# Altium schematic symbol library jlcpcb_2025_04_capacitors_extended_0402.schlib: 3594 symbols (part 13 of 20) (continued)
## GCM155R71H821KA37D
designator C?  Capacitance: 820pF  (hidden comment: *)
Capacitor, Ceramic (MLCC), 820pF, ±10%, 50V, X7R, ±10%, SMD 0402; Manufacturer: Murata Electronics; Manufacturer Part Number: GCM155R71H821KA37D; Package Size: 0402; JLCPCB Basic Part: No; JLCPCB Part Number: C2891595; Supplier 1: LCSC; Category: Capacitors - MLCC; Supplier Part Number 1: C2891595; Tolerance: ±10%; Voltage Rating: 50V; Temperature Coefficient: X7R; RoHS: Yes; ComponentLink1Description: Datasheet; ComponentLink1URL: https://wmsc.lcsc.com/wmsc/upload/file/pdf/v2/lcsc/2109101930_Murata-Electronics-GCM155R71H821KA37D_C2891595.pdf; ComponentLink2Description: JLCPCB Part URL; ComponentLink2URL: https://jlcpcb.com/partdetail/C2891595; ComponentLink3Description: LCSC Part URL; ComponentLink3URL: https://lcsc.com/product-detail/Multilayer-Ceramic-Capacitors-MLCC---SMD-SMT_Murata-Electronics-Murata-Electronics-GCM155R71H821KA37D_C2891595.html
footprint CAP-0402 (0402 (1005M) Capacitor)
pins: 1, 2

## GCM155R71H822KA55D
designator C?  Capacitance: 8.2nF  (hidden comment: *)
Capacitor, Ceramic (MLCC), 8.2nF, ±10%, 50V, X7R, ±10%, SMD 0402; Manufacturer: Murata Electronics; Manufacturer Part Number: GCM155R71H822KA55D; Package Size: 0402; JLCPCB Basic Part: No; JLCPCB Part Number: C161172; Supplier 1: LCSC; Category: Capacitors - MLCC; Supplier Part Number 1: C161172; Tolerance: ±10%; Voltage Rating: 50V; Temperature Coefficient: X7R; RoHS: Yes; ComponentLink1Description: Datasheet; ComponentLink1URL: https://wmsc.lcsc.com/wmsc/upload/file/pdf/v2/lcsc/2304140030_Murata-Electronics-GCM155R71H822KA55D_C161172.pdf; ComponentLink2Description: JLCPCB Part URL; ComponentLink2URL: https://jlcpcb.com/partdetail/C161172; ComponentLink3Description: LCSC Part URL; ComponentLink3URL: https://lcsc.com/product-detail/Multilayer-Ceramic-Capacitors-MLCC---SMD-SMT_Murata-Electronics-Murata-Electronics-GCM155R71H822KA55D_C161172.html
footprint CAP-0402 (0402 (1005M) Capacitor)
pins: 1, 2

## GCM155R72A102KA37D
designator C?  Capacitance: 1nF  (hidden comment: *)
Capacitor, Ceramic (MLCC), 1nF, ±10%, 100V, X7R, ±10%, SMD 0402; Manufacturer: Murata Electronics; Manufacturer Part Number: GCM155R72A102KA37D; Package Size: 0402; JLCPCB Basic Part: No; JLCPCB Part Number: C126538; Supplier 1: LCSC; Category: Capacitors - MLCC; Supplier Part Number 1: C126538; Tolerance: ±10%; Voltage Rating: 100V; Temperature Coefficient: X7R; RoHS: Yes; ComponentLink1Description: Datasheet; ComponentLink1URL: https://wmsc.lcsc.com/wmsc/upload/file/pdf/v2/lcsc/1811081510_Murata-Electronics-GCM155R72A102KA37D_C126538.pdf; ComponentLink2Description: JLCPCB Part URL; ComponentLink2URL: https://jlcpcb.com/partdetail/C126538; ComponentLink3Description: LCSC Part URL; ComponentLink3URL: https://lcsc.com/product-detail/Multilayer-Ceramic-Capacitors-MLCC---SMD-SMT_Murata-Electronics-Murata-Electronics-GCM155R72A102KA37D_C126538.html
footprint CAP-0402 (0402 (1005M) Capacitor)
pins: 1, 2

## GCM155R72A152KA37D
designator C?  Capacitance: 1.5nF  (hidden comment: *)
Capacitor, Ceramic (MLCC), 1.5nF, ±10%, 100V, X7R, ±10%, SMD 0402; Manufacturer: Murata Electronics; Manufacturer Part Number: GCM155R72A152KA37D; Package Size: 0402; JLCPCB Basic Part: No; JLCPCB Part Number: C782041; Supplier 1: LCSC; Category: Capacitors - MLCC; Supplier Part Number 1: C782041; Tolerance: ±10%; Voltage Rating: 100V; Temperature Coefficient: X7R; RoHS: Yes; ComponentLink1Description: Datasheet; ComponentLink1URL: https://wmsc.lcsc.com/wmsc/upload/file/pdf/v2/lcsc/2304140030_Murata-Electronics-GCM155R72A152KA37D_C782041.pdf; ComponentLink2Description: JLCPCB Part URL; ComponentLink2URL: https://jlcpcb.com/partdetail/C782041; ComponentLink3Description: LCSC Part URL; ComponentLink3URL: https://lcsc.com/product-detail/Multilayer-Ceramic-Capacitors-MLCC---SMD-SMT_Murata-Electronics-Murata-Electronics-GCM155R72A152KA37D_C782041.html
footprint CAP-0402 (0402 (1005M) Capacitor)
pins: 1, 2

## GCM155R72A182KA37D
designator C?  Capacitance: 1.8nF  (hidden comment: *)
Capacitor, Ceramic (MLCC), 1.8nF, ±10%, 100V, X7R, ±10%, SMD 0402; Manufacturer: Murata Electronics; Manufacturer Part Number: GCM155R72A182KA37D; Package Size: 0402; JLCPCB Basic Part: No; JLCPCB Part Number: C2941941; Supplier 1: LCSC; Category: Capacitors - MLCC; Supplier Part Number 1: C2941941; Tolerance: ±10%; Voltage Rating: 100V; Temperature Coefficient: X7R; RoHS: Yes; ComponentLink1Description: Datasheet; ComponentLink1URL: https://wmsc.lcsc.com/wmsc/upload/file/pdf/v2/lcsc/2201121900_Murata-Electronics-GCM155R72A182KA37D_C2941941.pdf; ComponentLink2Description: JLCPCB Part URL; ComponentLink2URL: https://jlcpcb.com/partdetail/C2941941; ComponentLink3Description: LCSC Part URL; ComponentLink3URL: https://lcsc.com/product-detail/Multilayer-Ceramic-Capacitors-MLCC---SMD-SMT_Murata-Electronics-Murata-Electronics-GCM155R72A182KA37D_C2941941.html
footprint CAP-0402 (0402 (1005M) Capacitor)
pins: 1, 2

## GCM155R72A221KA37D
designator C?  Capacitance: 220pF  (hidden comment: *)
Capacitor, Ceramic (MLCC), 220pF, ±10%, 100V, ±10%, SMD 0402; Manufacturer: Murata Electronics; Manufacturer Part Number: GCM155R72A221KA37D; Package Size: 0402; JLCPCB Basic Part: No; JLCPCB Part Number: C440146; Supplier 1: LCSC; Category: Capacitors - MLCC; Supplier Part Number 1: C440146; Tolerance: ±10%; Voltage Rating: 100V; RoHS: Yes; ComponentLink1Description: Datasheet; ComponentLink1URL: https://wmsc.lcsc.com/wmsc/upload/file/pdf/v2/lcsc/2304140030_Murata-Electronics-GCM155R72A221KA37D_C440146.pdf; ComponentLink2Description: JLCPCB Part URL; ComponentLink2URL: https://jlcpcb.com/partdetail/C440146; ComponentLink3Description: LCSC Part URL; ComponentLink3URL: https://lcsc.com/product-detail/Multilayer-Ceramic-Capacitors-MLCC---SMD-SMT_Murata-Electronics-Murata-Electronics-GCM155R72A221KA37D_C440146.html
footprint CAP-0402 (0402 (1005M) Capacitor)
pins: 1, 2

## GCM155R72A222KA01D
designator C?  Capacitance: 2.2nF  (hidden comment: *)
Capacitor, Ceramic (MLCC), 2.2nF, ±10%, 100V, X7R, ±10%, SMD 0402; Manufacturer: Murata Electronics; Manufacturer Part Number: GCM155R72A222KA01D; Package Size: 0402; JLCPCB Basic Part: No; JLCPCB Part Number: C2980802; Supplier 1: LCSC; Category: Capacitors - MLCC; Supplier Part Number 1: C2980802; Tolerance: ±10%; Voltage Rating: 100V; Temperature Coefficient: X7R; RoHS: Yes; ComponentLink1Description: Datasheet; ComponentLink1URL: https://wmsc.lcsc.com/wmsc/upload/file/pdf/v2/lcsc/2203041730_Murata-Electronics-GCM155R72A222KA01D_C2980802.pdf; ComponentLink2Description: JLCPCB Part URL; ComponentLink2URL: https://jlcpcb.com/partdetail/C2980802; ComponentLink3Description: LCSC Part URL; ComponentLink3URL: https://lcsc.com/product-detail/Multilayer-Ceramic-Capacitors-MLCC---SMD-SMT_Murata-Electronics-Murata-Electronics-GCM155R72A222KA01D_C2980802.html
footprint CAP-0402 (0402 (1005M) Capacitor)
pins: 1, 2

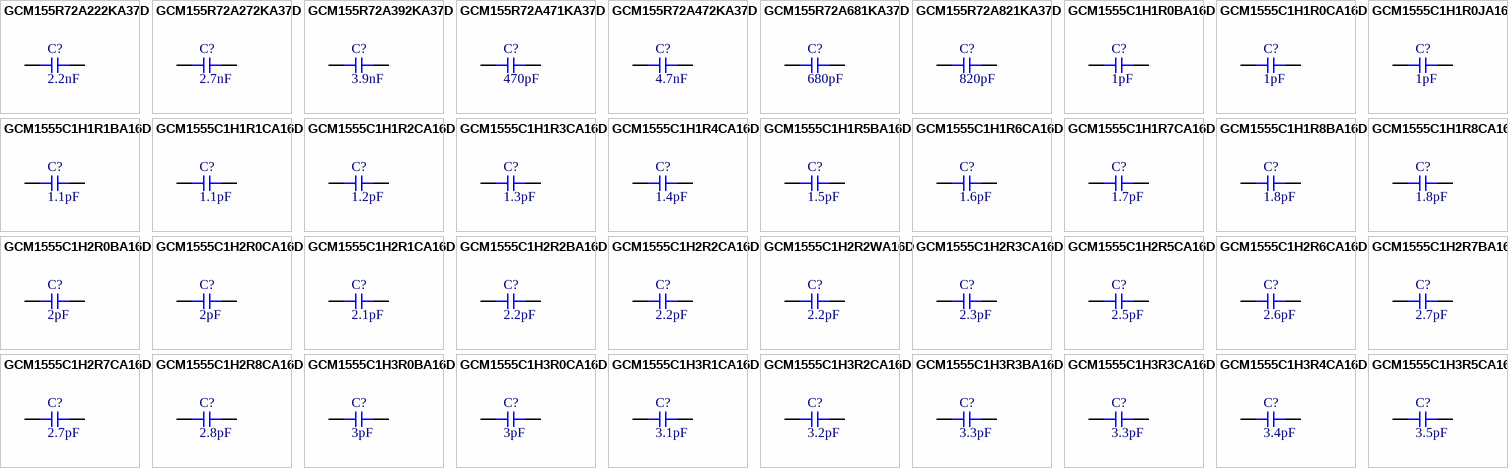
[diagram p57: symbols GCM155R72A222KA37D to GCM1555C1H3R5CA16D]

## GCM155R72A222KA37D
designator C?  Capacitance: 2.2nF  (hidden comment: *)
Capacitor, Ceramic (MLCC), 2.2nF, ±10%, 100V, X7R, ±10%, SMD 0402; Manufacturer: Murata Electronics; Manufacturer Part Number: GCM155R72A222KA37D; Package Size: 0402; JLCPCB Basic Part: No; JLCPCB Part Number: C710671; Supplier 1: LCSC; Category: Capacitors - MLCC; Supplier Part Number 1: C710671; Tolerance: ±10%; Voltage Rating: 100V; Temperature Coefficient: X7R; RoHS: Yes; ComponentLink1Description: Datasheet; ComponentLink1URL: https://wmsc.lcsc.com/wmsc/upload/file/pdf/v2/lcsc/2109092030_Murata-Electronics-GCM155R72A222KA37D_C710671.pdf; ComponentLink2Description: JLCPCB Part URL; ComponentLink2URL: https://jlcpcb.com/partdetail/C710671; ComponentLink3Description: LCSC Part URL; ComponentLink3URL: https://lcsc.com/product-detail/Multilayer-Ceramic-Capacitors-MLCC---SMD-SMT_Murata-Electronics-Murata-Electronics-GCM155R72A222KA37D_C710671.html
footprint CAP-0402 (0402 (1005M) Capacitor)
pins: 1, 2

## GCM155R72A272KA37D
designator C?  Capacitance: 2.7nF  (hidden comment: *)
Capacitor, Ceramic (MLCC), 2.7nF, ±10%, 100V, X7R, ±10%, SMD 0402; Manufacturer: Murata Electronics; Manufacturer Part Number: GCM155R72A272KA37D; Package Size: 0402; JLCPCB Basic Part: No; JLCPCB Part Number: C2941940; Supplier 1: LCSC; Category: Capacitors - MLCC; Supplier Part Number 1: C2941940; Tolerance: ±10%; Voltage Rating: 100V; Temperature Coefficient: X7R; RoHS: Yes; ComponentLink1Description: Datasheet; ComponentLink1URL: https://wmsc.lcsc.com/wmsc/upload/file/pdf/v2/lcsc/2201121900_Murata-Electronics-GCM155R72A272KA37D_C2941940.pdf; ComponentLink2Description: JLCPCB Part URL; ComponentLink2URL: https://jlcpcb.com/partdetail/C2941940; ComponentLink3Description: LCSC Part URL; ComponentLink3URL: https://lcsc.com/product-detail/Multilayer-Ceramic-Capacitors-MLCC---SMD-SMT_Murata-Electronics-Murata-Electronics-GCM155R72A272KA37D_C2941940.html
footprint CAP-0402 (0402 (1005M) Capacitor)
pins: 1, 2

## GCM155R72A392KA37D
designator C?  Capacitance: 3.9nF  (hidden comment: *)
Capacitor, Ceramic (MLCC), 3.9nF, ±10%, 100V, X7R, ±10%, SMD 0402; Manufacturer: Murata Electronics; Manufacturer Part Number: GCM155R72A392KA37D; Package Size: 0402; JLCPCB Basic Part: No; JLCPCB Part Number: C2941956; Supplier 1: LCSC; Category: Capacitors - MLCC; Supplier Part Number 1: C2941956; Tolerance: ±10%; Voltage Rating: 100V; Temperature Coefficient: X7R; RoHS: Yes; ComponentLink1Description: Datasheet; ComponentLink1URL: https://wmsc.lcsc.com/wmsc/upload/file/pdf/v2/lcsc/2201121900_Murata-Electronics-GCM155R72A392KA37D_C2941956.pdf; ComponentLink2Description: JLCPCB Part URL; ComponentLink2URL: https://jlcpcb.com/partdetail/C2941956; ComponentLink3Description: LCSC Part URL; ComponentLink3URL: https://lcsc.com/product-detail/Multilayer-Ceramic-Capacitors-MLCC---SMD-SMT_Murata-Electronics-Murata-Electronics-GCM155R72A392KA37D_C2941956.html
footprint CAP-0402 (0402 (1005M) Capacitor)
pins: 1, 2

## GCM155R72A471KA37D
designator C?  Capacitance: 470pF  (hidden comment: *)
Capacitor, Ceramic (MLCC), 470pF, ±10%, 100V, X7R, ±10%, SMD 0402; Manufacturer: Murata Electronics; Manufacturer Part Number: GCM155R72A471KA37D; Package Size: 0402; JLCPCB Basic Part: No; JLCPCB Part Number: C464449; Supplier 1: LCSC; Category: Capacitors - MLCC; Supplier Part Number 1: C464449; Tolerance: ±10%; Voltage Rating: 100V; Temperature Coefficient: X7R; RoHS: Yes; ComponentLink1Description: Datasheet; ComponentLink1URL: https://wmsc.lcsc.com/wmsc/upload/file/pdf/v2/lcsc/2304140030_Murata-Electronics-GCM155R72A471KA37D_C464449.pdf; ComponentLink2Description: JLCPCB Part URL; ComponentLink2URL: https://jlcpcb.com/partdetail/C464449; ComponentLink3Description: LCSC Part URL; ComponentLink3URL: https://lcsc.com/product-detail/Multilayer-Ceramic-Capacitors-MLCC---SMD-SMT_Murata-Electronics-Murata-Electronics-GCM155R72A471KA37D_C464449.html
footprint CAP-0402 (0402 (1005M) Capacitor)
pins: 1, 2

## GCM155R72A472KA37D
designator C?  Capacitance: 4.7nF  (hidden comment: *)
Capacitor, Ceramic (MLCC), 4.7nF, ±10%, 100V, X7R, ±10%, SMD 0402; Manufacturer: Murata Electronics; Manufacturer Part Number: GCM155R72A472KA37D; Package Size: 0402; JLCPCB Basic Part: No; JLCPCB Part Number: C710673; Supplier 1: LCSC; Category: Capacitors - MLCC; Supplier Part Number 1: C710673; Tolerance: ±10%; Voltage Rating: 100V; Temperature Coefficient: X7R; RoHS: Yes; ComponentLink1Description: Datasheet; ComponentLink1URL: https://wmsc.lcsc.com/wmsc/upload/file/pdf/v2/lcsc/2304140030_Murata-Electronics-GCM155R72A472KA37D_C710673.pdf; ComponentLink2Description: JLCPCB Part URL; ComponentLink2URL: https://jlcpcb.com/partdetail/C710673; ComponentLink3Description: LCSC Part URL; ComponentLink3URL: https://lcsc.com/product-detail/Multilayer-Ceramic-Capacitors-MLCC---SMD-SMT_Murata-Electronics-Murata-Electronics-GCM155R72A472KA37D_C710673.html
footprint CAP-0402 (0402 (1005M) Capacitor)
pins: 1, 2

## GCM155R72A681KA37D
designator C?  Capacitance: 680pF  (hidden comment: *)
Capacitor, Ceramic (MLCC), 680pF, ±10%, 100V, X7R, ±10%, SMD 0402; Manufacturer: Murata Electronics; Manufacturer Part Number: GCM155R72A681KA37D; Package Size: 0402; JLCPCB Basic Part: No; JLCPCB Part Number: C2189089; Supplier 1: LCSC; Category: Capacitors - MLCC; Supplier Part Number 1: C2189089; Tolerance: ±10%; Voltage Rating: 100V; Temperature Coefficient: X7R; RoHS: Yes; ComponentLink1Description: Datasheet; ComponentLink1URL: https://wmsc.lcsc.com/wmsc/upload/file/pdf/v2/lcsc/2311301509_Murata-Electronics-GCM155R72A681KA37D_C2189089.pdf; ComponentLink2Description: JLCPCB Part URL; ComponentLink2URL: https://jlcpcb.com/partdetail/C2189089; ComponentLink3Description: LCSC Part URL; ComponentLink3URL: https://lcsc.com/product-detail/Multilayer-Ceramic-Capacitors-MLCC---SMD-SMT_Murata-Electronics-Murata-Electronics-GCM155R72A681KA37D_C2189089.html
footprint CAP-0402 (0402 (1005M) Capacitor)
pins: 1, 2

## GCM155R72A821KA37D
designator C?  Capacitance: 820pF  (hidden comment: *)
Capacitor, Ceramic (MLCC), 820pF, ±10%, 100V, X7R, ±10%, SMD 0402; Manufacturer: Murata Electronics; Manufacturer Part Number: GCM155R72A821KA37D; Package Size: 0402; JLCPCB Basic Part: No; JLCPCB Part Number: C2941939; Supplier 1: LCSC; Category: Capacitors - MLCC; Supplier Part Number 1: C2941939; Tolerance: ±10%; Voltage Rating: 100V; Temperature Coefficient: X7R; RoHS: Yes; ComponentLink1Description: Datasheet; ComponentLink1URL: https://wmsc.lcsc.com/wmsc/upload/file/pdf/v2/lcsc/2201121900_Murata-Electronics-GCM155R72A821KA37D_C2941939.pdf; ComponentLink2Description: JLCPCB Part URL; ComponentLink2URL: https://jlcpcb.com/partdetail/C2941939; ComponentLink3Description: LCSC Part URL; ComponentLink3URL: https://lcsc.com/product-detail/Multilayer-Ceramic-Capacitors-MLCC---SMD-SMT_Murata-Electronics-Murata-Electronics-GCM155R72A821KA37D_C2941939.html
footprint CAP-0402 (0402 (1005M) Capacitor)
pins: 1, 2

## GCM1555C1H1R0BA16D
designator C?  Capacitance: 1pF  (hidden comment: *)
Capacitor, Ceramic (MLCC), 1pF, 50V, C0G, SMD 0402; Manufacturer: Murata Electronics; Manufacturer Part Number: GCM1555C1H1R0BA16D; Package Size: 0402; JLCPCB Basic Part: No; JLCPCB Part Number: C161148; Supplier 1: LCSC; Category: Capacitors - MLCC; Supplier Part Number 1: C161148; Voltage Rating: 50V; Temperature Coefficient: C0G; RoHS: Yes; ComponentLink1Description: Datasheet; ComponentLink1URL: https://wmsc.lcsc.com/wmsc/upload/file/pdf/v2/lcsc/2304140030_Murata-Electronics-GCM1555C1H1R0BA16D_C161148.pdf; ComponentLink2Description: JLCPCB Part URL; ComponentLink2URL: https://jlcpcb.com/partdetail/C161148; ComponentLink3Description: LCSC Part URL; ComponentLink3URL: https://lcsc.com/product-detail/Multilayer-Ceramic-Capacitors-MLCC---SMD-SMT_Murata-Electronics-Murata-Electronics-GCM1555C1H1R0BA16D_C161148.html
footprint CAP-0402 (0402 (1005M) Capacitor)
pins: 1, 2

## GCM1555C1H1R0CA16D
designator C?  Capacitance: 1pF  (hidden comment: *)
Capacitor, Ceramic (MLCC), 1pF, 50V, C0G, SMD 0402; Manufacturer: Murata Electronics; Manufacturer Part Number: GCM1555C1H1R0CA16D; Package Size: 0402; JLCPCB Basic Part: No; JLCPCB Part Number: C161149; Supplier 1: LCSC; Category: Capacitors - MLCC; Supplier Part Number 1: C161149; Voltage Rating: 50V; Temperature Coefficient: C0G; RoHS: Yes; ComponentLink1Description: Datasheet; ComponentLink1URL: https://wmsc.lcsc.com/wmsc/upload/file/pdf/v2/lcsc/2304140030_Murata-Electronics-GCM1555C1H1R0CA16D_C161149.pdf; ComponentLink2Description: JLCPCB Part URL; ComponentLink2URL: https://jlcpcb.com/partdetail/C161149; ComponentLink3Description: LCSC Part URL; ComponentLink3URL: https://lcsc.com/product-detail/Multilayer-Ceramic-Capacitors-MLCC---SMD-SMT_Murata-Electronics-Murata-Electronics-GCM1555C1H1R0CA16D_C161149.html
footprint CAP-0402 (0402 (1005M) Capacitor)
pins: 1, 2

## GCM1555C1H1R0JA16D
designator C?  Capacitance: 1pF  (hidden comment: *)
Capacitor, Ceramic (MLCC), 1pF, ±5%, 50V, C0G, ±5%, SMD 0402; Manufacturer: Murata Electronics; Manufacturer Part Number: GCM1555C1H1R0JA16D; Package Size: 0402; JLCPCB Basic Part: No; JLCPCB Part Number: C710646; Supplier 1: LCSC; Category: Capacitors - MLCC; Supplier Part Number 1: C710646; Tolerance: ±5%; Voltage Rating: 50V; Temperature Coefficient: C0G; RoHS: Yes; ComponentLink1Description: Datasheet; ComponentLink1URL: https://wmsc.lcsc.com/wmsc/upload/file/pdf/v2/lcsc/2201111430_Murata-Electronics-GCM1555C1H1R0JA16D_C710646.pdf; ComponentLink2Description: JLCPCB Part URL; ComponentLink2URL: https://jlcpcb.com/partdetail/C710646; ComponentLink3Description: LCSC Part URL; ComponentLink3URL: https://lcsc.com/product-detail/Multilayer-Ceramic-Capacitors-MLCC---SMD-SMT_Murata-Electronics-Murata-Electronics-GCM1555C1H1R0JA16D_C710646.html
footprint CAP-0402 (0402 (1005M) Capacitor)
pins: 1, 2

## GCM1555C1H1R1BA16D
designator C?  Capacitance: 1.1pF  (hidden comment: *)
Capacitor, Ceramic (MLCC), 1.1pF, 50V, C0G, SMD 0402; Manufacturer: Murata Electronics; Manufacturer Part Number: GCM1555C1H1R1BA16D; Package Size: 0402; JLCPCB Basic Part: No; JLCPCB Part Number: C2986284; Supplier 1: LCSC; Category: Capacitors - MLCC; Supplier Part Number 1: C2986284; Voltage Rating: 50V; Temperature Coefficient: C0G; RoHS: Yes; ComponentLink1Description: Datasheet; ComponentLink1URL: https://wmsc.lcsc.com/wmsc/upload/file/pdf/v2/lcsc/2204211700_Murata-Electronics-GCM1555C1H1R1BA16D_C2986284.pdf; ComponentLink2Description: JLCPCB Part URL; ComponentLink2URL: https://jlcpcb.com/partdetail/C2986284; ComponentLink3Description: LCSC Part URL; ComponentLink3URL: https://lcsc.com/product-detail/Multilayer-Ceramic-Capacitors-MLCC---SMD-SMT_Murata-Electronics-Murata-Electronics-GCM1555C1H1R1BA16D_C2986284.html
footprint CAP-0402 (0402 (1005M) Capacitor)
pins: 1, 2

## GCM1555C1H1R1CA16D
designator C?  Capacitance: 1.1pF  (hidden comment: *)
Capacitor, Ceramic (MLCC), 1.1pF, 50V, SMD 0402; Manufacturer: Murata Electronics; Manufacturer Part Number: GCM1555C1H1R1CA16D; Package Size: 0402; JLCPCB Basic Part: No; JLCPCB Part Number: C2190172; Supplier 1: LCSC; Category: Capacitors - MLCC; Supplier Part Number 1: C2190172; Voltage Rating: 50V; RoHS: Yes; ComponentLink1Description: Datasheet; ComponentLink1URL: https://wmsc.lcsc.com/wmsc/upload/file/pdf/v2/lcsc/2308111722_Murata-Electronics-GCM1555C1H1R1CA16D_C2190172.pdf; ComponentLink2Description: JLCPCB Part URL; ComponentLink2URL: https://jlcpcb.com/partdetail/C2190172; ComponentLink3Description: LCSC Part URL; ComponentLink3URL: https://lcsc.com/product-detail/Multilayer-Ceramic-Capacitors-MLCC---SMD-SMT_Murata-Electronics-Murata-Electronics-GCM1555C1H1R1CA16D_C2190172.html
footprint CAP-0402 (0402 (1005M) Capacitor)
pins: 1, 2

## GCM1555C1H1R2CA16D
designator C?  Capacitance: 1.2pF  (hidden comment: *)
Capacitor, Ceramic (MLCC), 1.2pF, 50V, C0G, SMD 0402; Manufacturer: Murata Electronics; Manufacturer Part Number: GCM1555C1H1R2CA16D; Package Size: 0402; JLCPCB Basic Part: No; JLCPCB Part Number: C430700; Supplier 1: LCSC; Category: Capacitors - MLCC; Supplier Part Number 1: C430700; Voltage Rating: 50V; Temperature Coefficient: C0G; RoHS: Yes; ComponentLink1Description: Datasheet; ComponentLink1URL: https://wmsc.lcsc.com/wmsc/upload/file/pdf/v2/lcsc/2304140030_Murata-Electronics-GCM1555C1H1R2CA16D_C430700.pdf; ComponentLink2Description: JLCPCB Part URL; ComponentLink2URL: https://jlcpcb.com/partdetail/C430700; ComponentLink3Description: LCSC Part URL; ComponentLink3URL: https://lcsc.com/product-detail/Multilayer-Ceramic-Capacitors-MLCC---SMD-SMT_Murata-Electronics-Murata-Electronics-GCM1555C1H1R2CA16D_C430700.html
footprint CAP-0402 (0402 (1005M) Capacitor)
pins: 1, 2

## GCM1555C1H1R3CA16D
designator C?  Capacitance: 1.3pF  (hidden comment: *)
Capacitor, Ceramic (MLCC), 1.3pF, 50V, SMD 0402; Manufacturer: Murata Electronics; Manufacturer Part Number: GCM1555C1H1R3CA16D; Package Size: 0402; JLCPCB Basic Part: No; JLCPCB Part Number: C2190189; Supplier 1: LCSC; Category: Capacitors - MLCC; Supplier Part Number 1: C2190189; Voltage Rating: 50V; RoHS: Yes; ComponentLink1Description: Datasheet; ComponentLink1URL: https://wmsc.lcsc.com/wmsc/upload/file/pdf/v2/lcsc/2308111722_Murata-Electronics-GCM1555C1H1R3CA16D_C2190189.pdf; ComponentLink2Description: JLCPCB Part URL; ComponentLink2URL: https://jlcpcb.com/partdetail/C2190189; ComponentLink3Description: LCSC Part URL; ComponentLink3URL: https://lcsc.com/product-detail/Multilayer-Ceramic-Capacitors-MLCC---SMD-SMT_Murata-Electronics-Murata-Electronics-GCM1555C1H1R3CA16D_C2190189.html
footprint CAP-0402 (0402 (1005M) Capacitor)
pins: 1, 2

## GCM1555C1H1R4CA16D
designator C?  Capacitance: 1.4pF  (hidden comment: *)
Capacitor, Ceramic (MLCC), 1.4pF, 50V, SMD 0402; Manufacturer: Murata Electronics; Manufacturer Part Number: GCM1555C1H1R4CA16D; Package Size: 0402; JLCPCB Basic Part: No; JLCPCB Part Number: C2190178; Supplier 1: LCSC; Category: Capacitors - MLCC; Supplier Part Number 1: C2190178; Voltage Rating: 50V; RoHS: Yes; ComponentLink1Description: Datasheet; ComponentLink1URL: https://wmsc.lcsc.com/wmsc/upload/file/pdf/v2/lcsc/2308111722_Murata-Electronics-GCM1555C1H1R4CA16D_C2190178.pdf; ComponentLink2Description: JLCPCB Part URL; ComponentLink2URL: https://jlcpcb.com/partdetail/C2190178; ComponentLink3Description: LCSC Part URL; ComponentLink3URL: https://lcsc.com/product-detail/Multilayer-Ceramic-Capacitors-MLCC---SMD-SMT_Murata-Electronics-Murata-Electronics-GCM1555C1H1R4CA16D_C2190178.html
footprint CAP-0402 (0402 (1005M) Capacitor)
pins: 1, 2

## GCM1555C1H1R5BA16D
designator C?  Capacitance: 1.5pF  (hidden comment: *)
Capacitor, Ceramic (MLCC), 1.5pF, 50V, C0G, SMD 0402; Manufacturer: Murata Electronics; Manufacturer Part Number: GCM1555C1H1R5BA16D; Package Size: 0402; JLCPCB Basic Part: No; JLCPCB Part Number: C126500; Supplier 1: LCSC; Category: Capacitors - MLCC; Supplier Part Number 1: C126500; Voltage Rating: 50V; Temperature Coefficient: C0G; RoHS: Yes; ComponentLink1Description: Datasheet; ComponentLink1URL: https://wmsc.lcsc.com/wmsc/upload/file/pdf/v2/lcsc/1811081514_Murata-Electronics-GCM1555C1H1R5BA16D_C126500.pdf; ComponentLink2Description: JLCPCB Part URL; ComponentLink2URL: https://jlcpcb.com/partdetail/C126500; ComponentLink3Description: LCSC Part URL; ComponentLink3URL: https://lcsc.com/product-detail/Multilayer-Ceramic-Capacitors-MLCC---SMD-SMT_Murata-Electronics-Murata-Electronics-GCM1555C1H1R5BA16D_C126500.html
footprint CAP-0402 (0402 (1005M) Capacitor)
pins: 1, 2

## GCM1555C1H1R6CA16D
designator C?  Capacitance: 1.6pF  (hidden comment: *)
Capacitor, Ceramic (MLCC), 1.6pF, 50V, SMD 0402; Manufacturer: Murata Electronics; Manufacturer Part Number: GCM1555C1H1R6CA16D; Package Size: 0402; JLCPCB Basic Part: No; JLCPCB Part Number: C2190146; Supplier 1: LCSC; Category: Capacitors - MLCC; Supplier Part Number 1: C2190146; Voltage Rating: 50V; RoHS: Yes; ComponentLink1Description: Datasheet; ComponentLink1URL: https://wmsc.lcsc.com/wmsc/upload/file/pdf/v2/lcsc/2308111722_Murata-Electronics-GCM1555C1H1R6CA16D_C2190146.pdf; ComponentLink2Description: JLCPCB Part URL; ComponentLink2URL: https://jlcpcb.com/partdetail/C2190146; ComponentLink3Description: LCSC Part URL; ComponentLink3URL: https://lcsc.com/product-detail/Multilayer-Ceramic-Capacitors-MLCC---SMD-SMT_Murata-Electronics-Murata-Electronics-GCM1555C1H1R6CA16D_C2190146.html
footprint CAP-0402 (0402 (1005M) Capacitor)
pins: 1, 2

## GCM1555C1H1R7CA16D
designator C?  Capacitance: 1.7pF  (hidden comment: *)
Capacitor, Ceramic (MLCC), 1.7pF, 50V, SMD 0402; Manufacturer: Murata Electronics; Manufacturer Part Number: GCM1555C1H1R7CA16D; Package Size: 0402; JLCPCB Basic Part: No; JLCPCB Part Number: C2190164; Supplier 1: LCSC; Category: Capacitors - MLCC; Supplier Part Number 1: C2190164; Voltage Rating: 50V; RoHS: Yes; ComponentLink1Description: Datasheet; ComponentLink1URL: https://wmsc.lcsc.com/wmsc/upload/file/pdf/v2/lcsc/2308111722_Murata-Electronics-GCM1555C1H1R7CA16D_C2190164.pdf; ComponentLink2Description: JLCPCB Part URL; ComponentLink2URL: https://jlcpcb.com/partdetail/C2190164; ComponentLink3Description: LCSC Part URL; ComponentLink3URL: https://lcsc.com/product-detail/Multilayer-Ceramic-Capacitors-MLCC---SMD-SMT_Murata-Electronics-Murata-Electronics-GCM1555C1H1R7CA16D_C2190164.html
footprint CAP-0402 (0402 (1005M) Capacitor)
pins: 1, 2

## GCM1555C1H1R8BA16D
designator C?  Capacitance: 1.8pF  (hidden comment: *)
Capacitor, Ceramic (MLCC), 1.8pF, 50V, SMD 0402; Manufacturer: Murata Electronics; Manufacturer Part Number: GCM1555C1H1R8BA16D; Package Size: 0402; JLCPCB Basic Part: No; JLCPCB Part Number: C368603; Supplier 1: LCSC; Category: Capacitors - MLCC; Supplier Part Number 1: C368603; Voltage Rating: 50V; RoHS: Yes; ComponentLink1Description: Datasheet; ComponentLink1URL: https://wmsc.lcsc.com/wmsc/upload/file/pdf/v2/lcsc/2201242230_Murata-Electronics-GCM1555C1H1R8BA16D_C368603.pdf; ComponentLink2Description: JLCPCB Part URL; ComponentLink2URL: https://jlcpcb.com/partdetail/C368603; ComponentLink3Description: LCSC Part URL; ComponentLink3URL: https://lcsc.com/product-detail/Multilayer-Ceramic-Capacitors-MLCC---SMD-SMT_Murata-Electronics-Murata-Electronics-GCM1555C1H1R8BA16D_C368603.html
footprint CAP-0402 (0402 (1005M) Capacitor)
pins: 1, 2

## GCM1555C1H1R8CA16D
designator C?  Capacitance: 1.8pF  (hidden comment: *)
Capacitor, Ceramic (MLCC), 1.8pF, 50V, C0G, SMD 0402; Manufacturer: Murata Electronics; Manufacturer Part Number: GCM1555C1H1R8CA16D; Package Size: 0402; JLCPCB Basic Part: No; JLCPCB Part Number: C161150; Supplier 1: LCSC; Category: Capacitors - MLCC; Supplier Part Number 1: C161150; Voltage Rating: 50V; Temperature Coefficient: C0G; RoHS: Yes; ComponentLink1Description: Datasheet; ComponentLink1URL: https://wmsc.lcsc.com/wmsc/upload/file/pdf/v2/lcsc/1811081551_Murata-Electronics-GCM1555C1H1R8CA16D_C161150.pdf; ComponentLink2Description: JLCPCB Part URL; ComponentLink2URL: https://jlcpcb.com/partdetail/C161150; ComponentLink3Description: LCSC Part URL; ComponentLink3URL: https://lcsc.com/product-detail/Multilayer-Ceramic-Capacitors-MLCC---SMD-SMT_Murata-Electronics-Murata-Electronics-GCM1555C1H1R8CA16D_C161150.html
footprint CAP-0402 (0402 (1005M) Capacitor)
pins: 1, 2

## GCM1555C1H2R0BA16D
designator C?  Capacitance: 2pF  (hidden comment: *)
Capacitor, Ceramic (MLCC), 2pF, null, SMD 0402; Manufacturer: Murata Electronics; Manufacturer Part Number: GCM1555C1H2R0BA16D; Package Size: 0402; JLCPCB Basic Part: No; JLCPCB Part Number: C368604; Supplier 1: LCSC; Category: Capacitors - MLCC; Supplier Part Number 1: C368604; Voltage Rating: null; RoHS: Yes; ComponentLink1Description: Datasheet; ComponentLink1URL: https://wmsc.lcsc.com/wmsc/upload/file/pdf/v2/lcsc/2012102138_Murata-Electronics-GCM1555C1H2R0BA16D_C368604.pdf; ComponentLink2Description: JLCPCB Part URL; ComponentLink2URL: https://jlcpcb.com/partdetail/C368604; ComponentLink3Description: LCSC Part URL; ComponentLink3URL: https://lcsc.com/product-detail/Multilayer-Ceramic-Capacitors-MLCC---SMD-SMT_Murata-Electronics-Murata-Electronics-GCM1555C1H2R0BA16D_C368604.html
footprint CAP-0402 (0402 (1005M) Capacitor)
pins: 1, 2

## GCM1555C1H2R0CA16D
designator C?  Capacitance: 2pF  (hidden comment: *)
Capacitor, Ceramic (MLCC), 2pF, 50V, C0G, SMD 0402; Manufacturer: Murata Electronics; Manufacturer Part Number: GCM1555C1H2R0CA16D; Package Size: 0402; JLCPCB Basic Part: No; JLCPCB Part Number: C430701; Supplier 1: LCSC; Category: Capacitors - MLCC; Supplier Part Number 1: C430701; Voltage Rating: 50V; Temperature Coefficient: C0G; RoHS: Yes; ComponentLink1Description: Datasheet; ComponentLink1URL: https://wmsc.lcsc.com/wmsc/upload/file/pdf/v2/lcsc/2304140030_Murata-Electronics-GCM1555C1H2R0CA16D_C430701.pdf; ComponentLink2Description: JLCPCB Part URL; ComponentLink2URL: https://jlcpcb.com/partdetail/C430701; ComponentLink3Description: LCSC Part URL; ComponentLink3URL: https://lcsc.com/product-detail/Multilayer-Ceramic-Capacitors-MLCC---SMD-SMT_Murata-Electronics-Murata-Electronics-GCM1555C1H2R0CA16D_C430701.html
footprint CAP-0402 (0402 (1005M) Capacitor)
pins: 1, 2

## GCM1555C1H2R1CA16D
designator C?  Capacitance: 2.1pF  (hidden comment: *)
Capacitor, Ceramic (MLCC), 2.1pF, 50V, C0G, SMD 0402; Manufacturer: Murata Electronics; Manufacturer Part Number: GCM1555C1H2R1CA16D; Package Size: 0402; JLCPCB Basic Part: No; JLCPCB Part Number: C2941932; Supplier 1: LCSC; Category: Capacitors - MLCC; Supplier Part Number 1: C2941932; Voltage Rating: 50V; Temperature Coefficient: C0G; RoHS: Yes; ComponentLink1Description: Datasheet; ComponentLink1URL: https://wmsc.lcsc.com/wmsc/upload/file/pdf/v2/lcsc/2201121900_Murata-Electronics-GCM1555C1H2R1CA16D_C2941932.pdf; ComponentLink2Description: JLCPCB Part URL; ComponentLink2URL: https://jlcpcb.com/partdetail/C2941932; ComponentLink3Description: LCSC Part URL; ComponentLink3URL: https://lcsc.com/product-detail/Multilayer-Ceramic-Capacitors-MLCC---SMD-SMT_Murata-Electronics-Murata-Electronics-GCM1555C1H2R1CA16D_C2941932.html
footprint CAP-0402 (0402 (1005M) Capacitor)
pins: 1, 2

## GCM1555C1H2R2BA16D
designator C?  Capacitance: 2.2pF  (hidden comment: *)
Capacitor, Ceramic (MLCC), 2.2pF, null, SMD 0402; Manufacturer: Murata Electronics; Manufacturer Part Number: GCM1555C1H2R2BA16D; Package Size: 0402; JLCPCB Basic Part: No; JLCPCB Part Number: C368597; Supplier 1: LCSC; Category: Capacitors - MLCC; Supplier Part Number 1: C368597; Voltage Rating: null; RoHS: Yes; ComponentLink1Description: Datasheet; ComponentLink1URL: https://wmsc.lcsc.com/wmsc/upload/file/pdf/v2/lcsc/2201242230_Murata-Electronics-GCM1555C1H2R2BA16D_C368597.pdf; ComponentLink2Description: JLCPCB Part URL; ComponentLink2URL: https://jlcpcb.com/partdetail/C368597; ComponentLink3Description: LCSC Part URL; ComponentLink3URL: https://lcsc.com/product-detail/Multilayer-Ceramic-Capacitors-MLCC---SMD-SMT_Murata-Electronics-Murata-Electronics-GCM1555C1H2R2BA16D_C368597.html
footprint CAP-0402 (0402 (1005M) Capacitor)
pins: 1, 2

## GCM1555C1H2R2CA16D
designator C?  Capacitance: 2.2pF  (hidden comment: *)
Capacitor, Ceramic (MLCC), 2.2pF, null, SMD 0402; Manufacturer: Murata Electronics; Manufacturer Part Number: GCM1555C1H2R2CA16D; Package Size: 0402; JLCPCB Basic Part: No; JLCPCB Part Number: C913535; Supplier 1: LCSC; Category: Capacitors - MLCC; Supplier Part Number 1: C913535; Voltage Rating: null; RoHS: Yes; ComponentLink1Description: Datasheet; ComponentLink1URL: https://wmsc.lcsc.com/wmsc/upload/file/pdf/v2/lcsc/2201131300_Murata-Electronics-GCM1555C1H2R2CA16D_C913535.pdf; ComponentLink2Description: JLCPCB Part URL; ComponentLink2URL: https://jlcpcb.com/partdetail/C913535; ComponentLink3Description: LCSC Part URL; ComponentLink3URL: https://lcsc.com/product-detail/Multilayer-Ceramic-Capacitors-MLCC---SMD-SMT_Murata-Electronics-Murata-Electronics-GCM1555C1H2R2CA16D_C913535.html
footprint CAP-0402 (0402 (1005M) Capacitor)
pins: 1, 2

## GCM1555C1H2R2WA16D
designator C?  Capacitance: 2.2pF  (hidden comment: *)
Capacitor, Ceramic (MLCC), 2.2pF, 50V, C0G, SMD 0402; Manufacturer: Murata Electronics; Manufacturer Part Number: GCM1555C1H2R2WA16D; Package Size: 0402; JLCPCB Basic Part: No; JLCPCB Part Number: C437438; Supplier 1: LCSC; Category: Capacitors - MLCC; Supplier Part Number 1: C437438; Voltage Rating: 50V; Temperature Coefficient: C0G; RoHS: Yes; ComponentLink1Description: Datasheet; ComponentLink1URL: https://wmsc.lcsc.com/wmsc/upload/file/pdf/v2/lcsc/2304140030_Murata-Electronics-GCM1555C1H2R2WA16D_C437438.pdf; ComponentLink2Description: JLCPCB Part URL; ComponentLink2URL: https://jlcpcb.com/partdetail/C437438; ComponentLink3Description: LCSC Part URL; ComponentLink3URL: https://lcsc.com/product-detail/Multilayer-Ceramic-Capacitors-MLCC---SMD-SMT_Murata-Electronics-Murata-Electronics-GCM1555C1H2R2WA16D_C437438.html
footprint CAP-0402 (0402 (1005M) Capacitor)
pins: 1, 2

## GCM1555C1H2R3CA16D
designator C?  Capacitance: 2.3pF  (hidden comment: *)
Capacitor, Ceramic (MLCC), 2.3pF, 50V, SMD 0402; Manufacturer: Murata Electronics; Manufacturer Part Number: GCM1555C1H2R3CA16D; Package Size: 0402; JLCPCB Basic Part: No; JLCPCB Part Number: C2190124; Supplier 1: LCSC; Category: Capacitors - MLCC; Supplier Part Number 1: C2190124; Voltage Rating: 50V; RoHS: Yes; ComponentLink1Description: Datasheet; ComponentLink1URL: https://wmsc.lcsc.com/wmsc/upload/file/pdf/v2/lcsc/2308111722_Murata-Electronics-GCM1555C1H2R3CA16D_C2190124.pdf; ComponentLink2Description: JLCPCB Part URL; ComponentLink2URL: https://jlcpcb.com/partdetail/C2190124; ComponentLink3Description: LCSC Part URL; ComponentLink3URL: https://lcsc.com/product-detail/Multilayer-Ceramic-Capacitors-MLCC---SMD-SMT_Murata-Electronics-Murata-Electronics-GCM1555C1H2R3CA16D_C2190124.html
footprint CAP-0402 (0402 (1005M) Capacitor)
pins: 1, 2

## GCM1555C1H2R5CA16D
designator C?  Capacitance: 2.5pF  (hidden comment: *)
Capacitor, Ceramic (MLCC), 2.5pF, 50V, C0G, SMD 0402; Manufacturer: Murata Electronics; Manufacturer Part Number: GCM1555C1H2R5CA16D; Package Size: 0402; JLCPCB Basic Part: No; JLCPCB Part Number: C161151; Supplier 1: LCSC; Category: Capacitors - MLCC; Supplier Part Number 1: C161151; Voltage Rating: 50V; Temperature Coefficient: C0G; RoHS: Yes; ComponentLink1Description: Datasheet; ComponentLink1URL: https://wmsc.lcsc.com/wmsc/upload/file/pdf/v2/lcsc/1811081551_Murata-Electronics-GCM1555C1H2R5CA16D_C161151.pdf; ComponentLink2Description: JLCPCB Part URL; ComponentLink2URL: https://jlcpcb.com/partdetail/C161151; ComponentLink3Description: LCSC Part URL; ComponentLink3URL: https://lcsc.com/product-detail/Multilayer-Ceramic-Capacitors-MLCC---SMD-SMT_Murata-Electronics-Murata-Electronics-GCM1555C1H2R5CA16D_C161151.html
footprint CAP-0402 (0402 (1005M) Capacitor)
pins: 1, 2

## GCM1555C1H2R6CA16D
designator C?  Capacitance: 2.6pF  (hidden comment: *)
Capacitor, Ceramic (MLCC), 2.6pF, 50V, SMD 0402; Manufacturer: Murata Electronics; Manufacturer Part Number: GCM1555C1H2R6CA16D; Package Size: 0402; JLCPCB Basic Part: No; JLCPCB Part Number: C2190109; Supplier 1: LCSC; Category: Capacitors - MLCC; Supplier Part Number 1: C2190109; Voltage Rating: 50V; RoHS: Yes; ComponentLink1Description: Datasheet; ComponentLink1URL: https://wmsc.lcsc.com/wmsc/upload/file/pdf/v2/lcsc/2308111722_Murata-Electronics-GCM1555C1H2R6CA16D_C2190109.pdf; ComponentLink2Description: JLCPCB Part URL; ComponentLink2URL: https://jlcpcb.com/partdetail/C2190109; ComponentLink3Description: LCSC Part URL; ComponentLink3URL: https://lcsc.com/product-detail/Multilayer-Ceramic-Capacitors-MLCC---SMD-SMT_Murata-Electronics-Murata-Electronics-GCM1555C1H2R6CA16D_C2190109.html
footprint CAP-0402 (0402 (1005M) Capacitor)
pins: 1, 2

## GCM1555C1H2R7BA16D
designator C?  Capacitance: 2.7pF  (hidden comment: *)
Capacitor, Ceramic (MLCC), 2.7pF, 50V, SMD 0402; Manufacturer: Murata Electronics; Manufacturer Part Number: GCM1555C1H2R7BA16D; Package Size: 0402; JLCPCB Basic Part: No; JLCPCB Part Number: C440145; Supplier 1: LCSC; Category: Capacitors - MLCC; Supplier Part Number 1: C440145; Voltage Rating: 50V; RoHS: Yes; ComponentLink1Description: Datasheet; ComponentLink1URL: https://wmsc.lcsc.com/wmsc/upload/file/pdf/v2/lcsc/2304140030_Murata-Electronics-GCM1555C1H2R7BA16D_C440145.pdf; ComponentLink2Description: JLCPCB Part URL; ComponentLink2URL: https://jlcpcb.com/partdetail/C440145; ComponentLink3Description: LCSC Part URL; ComponentLink3URL: https://lcsc.com/product-detail/Multilayer-Ceramic-Capacitors-MLCC---SMD-SMT_Murata-Electronics-Murata-Electronics-GCM1555C1H2R7BA16D_C440145.html
footprint CAP-0402 (0402 (1005M) Capacitor)
pins: 1, 2

## GCM1555C1H2R7CA16D
designator C?  Capacitance: 2.7pF  (hidden comment: *)
Capacitor, Ceramic (MLCC), 2.7pF, SMD 0402; Manufacturer: Murata Electronics; Manufacturer Part Number: GCM1555C1H2R7CA16D; Package Size: 0402; JLCPCB Basic Part: No; JLCPCB Part Number: C710650; Supplier 1: LCSC; Category: Capacitors - MLCC; Supplier Part Number 1: C710650; RoHS: Yes; ComponentLink1Description: Datasheet; ComponentLink1URL: https://wmsc.lcsc.com/wmsc/upload/file/pdf/v2/lcsc/2304140030_Murata-Electronics-GCM1555C1H2R7CA16D_C710650.pdf; ComponentLink2Description: JLCPCB Part URL; ComponentLink2URL: https://jlcpcb.com/partdetail/C710650; ComponentLink3Description: LCSC Part URL; ComponentLink3URL: https://lcsc.com/product-detail/Multilayer-Ceramic-Capacitors-MLCC---SMD-SMT_Murata-Electronics-Murata-Electronics-GCM1555C1H2R7CA16D_C710650.html
footprint CAP-0402 (0402 (1005M) Capacitor)
pins: 1, 2

## GCM1555C1H2R8CA16D
designator C?  Capacitance: 2.8pF  (hidden comment: *)
Capacitor, Ceramic (MLCC), 2.8pF, 50V, SMD 0402; Manufacturer: Murata Electronics; Manufacturer Part Number: GCM1555C1H2R8CA16D; Package Size: 0402; JLCPCB Basic Part: No; JLCPCB Part Number: C2190088; Supplier 1: LCSC; Category: Capacitors - MLCC; Supplier Part Number 1: C2190088; Voltage Rating: 50V; RoHS: Yes; ComponentLink1Description: Datasheet; ComponentLink1URL: https://wmsc.lcsc.com/wmsc/upload/file/pdf/v2/lcsc/2308111722_Murata-Electronics-GCM1555C1H2R8CA16D_C2190088.pdf; ComponentLink2Description: JLCPCB Part URL; ComponentLink2URL: https://jlcpcb.com/partdetail/C2190088; ComponentLink3Description: LCSC Part URL; ComponentLink3URL: https://lcsc.com/product-detail/Multilayer-Ceramic-Capacitors-MLCC---SMD-SMT_Murata-Electronics-Murata-Electronics-GCM1555C1H2R8CA16D_C2190088.html
footprint CAP-0402 (0402 (1005M) Capacitor)
pins: 1, 2

## GCM1555C1H3R0BA16D
designator C?  Capacitance: 3pF  (hidden comment: *)
Capacitor, Ceramic (MLCC), 3pF, 50V, C0G, SMD 0402; Manufacturer: Murata Electronics; Manufacturer Part Number: GCM1555C1H3R0BA16D; Package Size: 0402; JLCPCB Basic Part: No; JLCPCB Part Number: C126508; Supplier 1: LCSC; Category: Capacitors - MLCC; Supplier Part Number 1: C126508; Voltage Rating: 50V; Temperature Coefficient: C0G; RoHS: Yes; ComponentLink1Description: Datasheet; ComponentLink1URL: https://wmsc.lcsc.com/wmsc/upload/file/pdf/v2/lcsc/1811081516_Murata-Electronics-GCM1555C1H3R0BA16D_C126508.pdf; ComponentLink2Description: JLCPCB Part URL; ComponentLink2URL: https://jlcpcb.com/partdetail/C126508; ComponentLink3Description: LCSC Part URL; ComponentLink3URL: https://lcsc.com/product-detail/Multilayer-Ceramic-Capacitors-MLCC---SMD-SMT_Murata-Electronics-Murata-Electronics-GCM1555C1H3R0BA16D_C126508.html
footprint CAP-0402 (0402 (1005M) Capacitor)
pins: 1, 2

## GCM1555C1H3R0CA16D
designator C?  Capacitance: 3pF  (hidden comment: *)
Capacitor, Ceramic (MLCC), 3pF, 50V, C0G, SMD 0402; Manufacturer: Murata Electronics; Manufacturer Part Number: GCM1555C1H3R0CA16D; Package Size: 0402; JLCPCB Basic Part: No; JLCPCB Part Number: C437440; Supplier 1: LCSC; Category: Capacitors - MLCC; Supplier Part Number 1: C437440; Voltage Rating: 50V; Temperature Coefficient: C0G; RoHS: Yes; ComponentLink1Description: Datasheet; ComponentLink1URL: https://wmsc.lcsc.com/wmsc/upload/file/pdf/v2/lcsc/2304140030_Murata-Electronics-GCM1555C1H3R0CA16D_C437440.pdf; ComponentLink2Description: JLCPCB Part URL; ComponentLink2URL: https://jlcpcb.com/partdetail/C437440; ComponentLink3Description: LCSC Part URL; ComponentLink3URL: https://lcsc.com/product-detail/Multilayer-Ceramic-Capacitors-MLCC---SMD-SMT_Murata-Electronics-Murata-Electronics-GCM1555C1H3R0CA16D_C437440.html
footprint CAP-0402 (0402 (1005M) Capacitor)
pins: 1, 2

## GCM1555C1H3R1CA16D
designator C?  Capacitance: 3.1pF  (hidden comment: *)
Capacitor, Ceramic (MLCC), 3.1pF, 50V, SMD 0402; Manufacturer: Murata Electronics; Manufacturer Part Number: GCM1555C1H3R1CA16D; Package Size: 0402; JLCPCB Basic Part: No; JLCPCB Part Number: C2189981; Supplier 1: LCSC; Category: Capacitors - MLCC; Supplier Part Number 1: C2189981; Voltage Rating: 50V; RoHS: Yes; ComponentLink1Description: Datasheet; ComponentLink1URL: https://wmsc.lcsc.com/wmsc/upload/file/pdf/v2/lcsc/2308111721_Murata-Electronics-GCM1555C1H3R1CA16D_C2189981.pdf; ComponentLink2Description: JLCPCB Part URL; ComponentLink2URL: https://jlcpcb.com/partdetail/C2189981; ComponentLink3Description: LCSC Part URL; ComponentLink3URL: https://lcsc.com/product-detail/Multilayer-Ceramic-Capacitors-MLCC---SMD-SMT_Murata-Electronics-Murata-Electronics-GCM1555C1H3R1CA16D_C2189981.html
footprint CAP-0402 (0402 (1005M) Capacitor)
pins: 1, 2

## GCM1555C1H3R2CA16D
designator C?  Capacitance: 3.2pF  (hidden comment: *)
Capacitor, Ceramic (MLCC), 3.2pF, 50V, SMD 0402; Manufacturer: Murata Electronics; Manufacturer Part Number: GCM1555C1H3R2CA16D; Package Size: 0402; JLCPCB Basic Part: No; JLCPCB Part Number: C2189985; Supplier 1: LCSC; Category: Capacitors - MLCC; Supplier Part Number 1: C2189985; Voltage Rating: 50V; RoHS: Yes; ComponentLink1Description: Datasheet; ComponentLink1URL: https://wmsc.lcsc.com/wmsc/upload/file/pdf/v2/lcsc/2308111721_Murata-Electronics-GCM1555C1H3R2CA16D_C2189985.pdf; ComponentLink2Description: JLCPCB Part URL; ComponentLink2URL: https://jlcpcb.com/partdetail/C2189985; ComponentLink3Description: LCSC Part URL; ComponentLink3URL: https://lcsc.com/product-detail/Multilayer-Ceramic-Capacitors-MLCC---SMD-SMT_Murata-Electronics-Murata-Electronics-GCM1555C1H3R2CA16D_C2189985.html
footprint CAP-0402 (0402 (1005M) Capacitor)
pins: 1, 2

## GCM1555C1H3R3BA16D
designator C?  Capacitance: 3.3pF  (hidden comment: *)
Capacitor, Ceramic (MLCC), 3.3pF, 50V, C0G, SMD 0402; Manufacturer: Murata Electronics; Manufacturer Part Number: GCM1555C1H3R3BA16D; Package Size: 0402; JLCPCB Basic Part: No; JLCPCB Part Number: C415378; Supplier 1: LCSC; Category: Capacitors - MLCC; Supplier Part Number 1: C415378; Voltage Rating: 50V; Temperature Coefficient: C0G; RoHS: Yes; ComponentLink1Description: Datasheet; ComponentLink1URL: https://wmsc.lcsc.com/wmsc/upload/file/pdf/v2/lcsc/1912111437_Murata-Electronics-GCM1555C1H3R3BA16D_C415378.pdf; ComponentLink2Description: JLCPCB Part URL; ComponentLink2URL: https://jlcpcb.com/partdetail/C415378; ComponentLink3Description: LCSC Part URL; ComponentLink3URL: https://lcsc.com/product-detail/Multilayer-Ceramic-Capacitors-MLCC---SMD-SMT_Murata-Electronics-Murata-Electronics-GCM1555C1H3R3BA16D_C415378.html
footprint CAP-0402 (0402 (1005M) Capacitor)
pins: 1, 2

## GCM1555C1H3R3CA16D
designator C?  Capacitance: 3.3pF  (hidden comment: *)
Capacitor, Ceramic (MLCC), 3.3pF, null, SMD 0402; Manufacturer: Murata Electronics; Manufacturer Part Number: GCM1555C1H3R3CA16D; Package Size: 0402; JLCPCB Basic Part: No; JLCPCB Part Number: C710652; Supplier 1: LCSC; Category: Capacitors - MLCC; Supplier Part Number 1: C710652; Voltage Rating: null; RoHS: Yes; ComponentLink1Description: Datasheet; ComponentLink1URL: https://wmsc.lcsc.com/wmsc/upload/file/pdf/v2/lcsc/2011170205_Murata-Electronics-GCM1555C1H3R3CA16D_C710652.pdf; ComponentLink2Description: JLCPCB Part URL; ComponentLink2URL: https://jlcpcb.com/partdetail/C710652; ComponentLink3Description: LCSC Part URL; ComponentLink3URL: https://lcsc.com/product-detail/Multilayer-Ceramic-Capacitors-MLCC---SMD-SMT_Murata-Electronics-Murata-Electronics-GCM1555C1H3R3CA16D_C710652.html
footprint CAP-0402 (0402 (1005M) Capacitor)
pins: 1, 2

## GCM1555C1H3R4CA16D
designator C?  Capacitance: 3.4pF  (hidden comment: *)
Capacitor, Ceramic (MLCC), 3.4pF, 50V, C0G, SMD 0402; Manufacturer: Murata Electronics; Manufacturer Part Number: GCM1555C1H3R4CA16D; Package Size: 0402; JLCPCB Basic Part: No; JLCPCB Part Number: C2941930; Supplier 1: LCSC; Category: Capacitors - MLCC; Supplier Part Number 1: C2941930; Voltage Rating: 50V; Temperature Coefficient: C0G; RoHS: Yes; ComponentLink1Description: Datasheet; ComponentLink1URL: https://wmsc.lcsc.com/wmsc/upload/file/pdf/v2/lcsc/2201121900_Murata-Electronics-GCM1555C1H3R4CA16D_C2941930.pdf; ComponentLink2Description: JLCPCB Part URL; ComponentLink2URL: https://jlcpcb.com/partdetail/C2941930; ComponentLink3Description: LCSC Part URL; ComponentLink3URL: https://lcsc.com/product-detail/Multilayer-Ceramic-Capacitors-MLCC---SMD-SMT_Murata-Electronics-Murata-Electronics-GCM1555C1H3R4CA16D_C2941930.html
footprint CAP-0402 (0402 (1005M) Capacitor)
pins: 1, 2

## GCM1555C1H3R5CA16D
designator C?  Capacitance: 3.5pF  (hidden comment: *)
Capacitor, Ceramic (MLCC), 3.5pF, 50V, C0G, SMD 0402; Manufacturer: Murata Electronics; Manufacturer Part Number: GCM1555C1H3R5CA16D; Package Size: 0402; JLCPCB Basic Part: No; JLCPCB Part Number: C2941937; Supplier 1: LCSC; Category: Capacitors - MLCC; Supplier Part Number 1: C2941937; Voltage Rating: 50V; Temperature Coefficient: C0G; RoHS: Yes; ComponentLink1Description: Datasheet; ComponentLink1URL: https://wmsc.lcsc.com/wmsc/upload/file/pdf/v2/lcsc/2201121900_Murata-Electronics-GCM1555C1H3R5CA16D_C2941937.pdf; ComponentLink2Description: JLCPCB Part URL; ComponentLink2URL: https://jlcpcb.com/partdetail/C2941937; ComponentLink3Description: LCSC Part URL; ComponentLink3URL: https://lcsc.com/product-detail/Multilayer-Ceramic-Capacitors-MLCC---SMD-SMT_Murata-Electronics-Murata-Electronics-GCM1555C1H3R5CA16D_C2941937.html
footprint CAP-0402 (0402 (1005M) Capacitor)
pins: 1, 2
